# Altium footprint library 04.连接器件.pcb.PCBLIB: 363 footprints (part 10 of 23)
Each footprint in its own frame and in the unit in brackets; x right, y up, seen from the top. Pads: shape width x height; smd on the part's side, far side on the other; paste and mask are expansions set on the pad; w line width, h text height; cw(c..) or ccw(c..) is an arc to the next point about the centre after c.
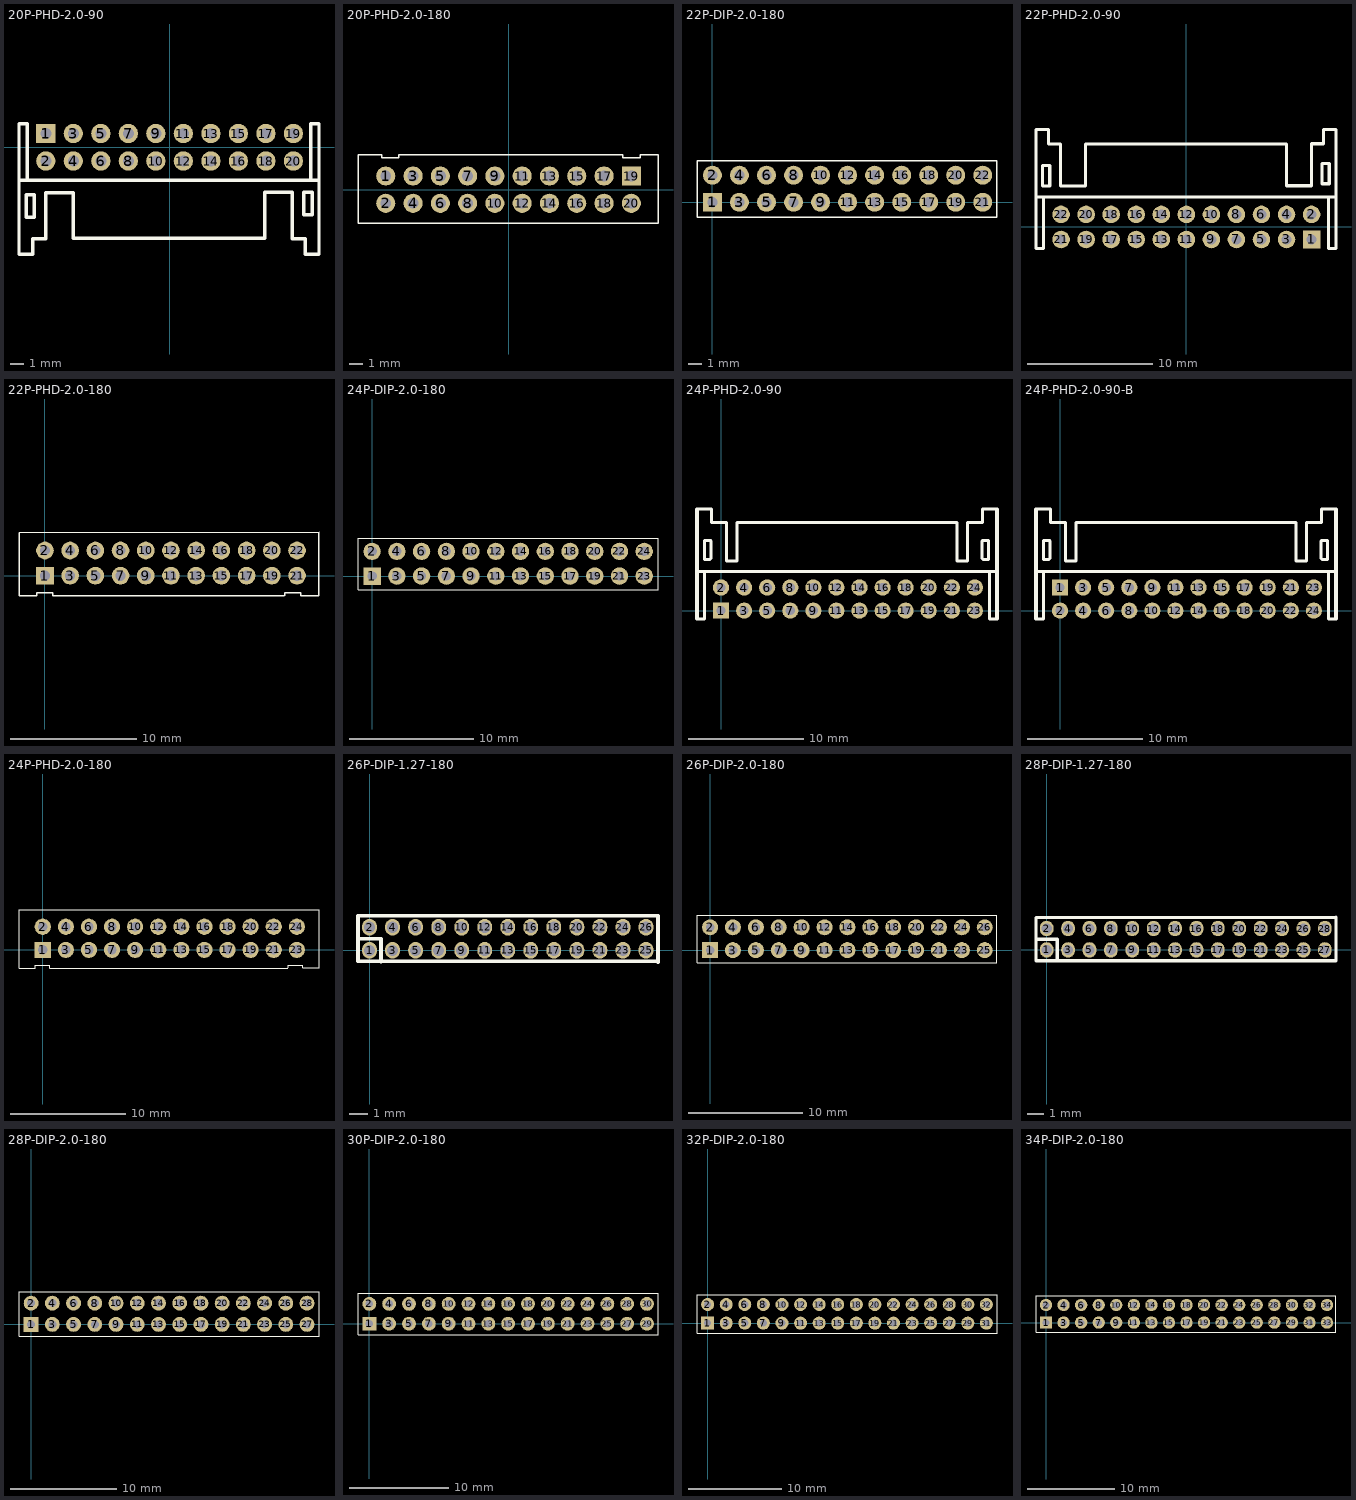
[diagram p9: the footprints below, top view; thin cyan lines are the x and y axes]

## 20P-PHD-2.0-90 [mm]
pads (20):
  rect 1.4x1.4 hole 0.8: 1(-9,1)
  round 1.4 hole 0.8: 2(-9,-1) 3(-7,1) 4(-7,-1) 5(-5,1) 6(-5,-1) 7(-3,1) 8(-3,-1) 9(-1,1) 10(-1,-1) 11(1,1) 12(1,-1) 13(3,1) 14(3,-1) 15(5,1) 16(5,-1) 17(7,1) 18(7,-1) 19(9,1) 20(9,-1)
TopOverlay:
  lines w0.254: -10.827,-2.404 -10.377,-2.404 ; -10.35,-2.404 -10.35,1.711 -10.95,1.711 -10.95,-7.789 -9.95,-7.789 -9.95,-6.645 -9,-6.645 -9,-3.293 -7,-3.293 -7,-6.62 3,-6.62 6.91,-6.62 ; -10.342,-2.404 8.71,-2.404 ; 6.91,-6.605 6.91,-3.278 8.91,-3.278 8.91,-6.631 9.86,-6.631 9.86,-7.774 10.86,-7.774 10.86,1.726 10.26,1.726 10.26,-2.389 ; 8.719,-2.404 10.818,-2.404 ; -10.417,-5.071 -9.832,-5.071 -9.832,-3.445 -10.417,-3.445 -10.417,-5.071 ; 9.768,-4.904 9.768,-3.278 10.352,-3.278 10.352,-4.904 9.768,-4.904
3D body: height 5, standoff 0, extent -10.95,-7.789 10.86,1.711

## 20P-PHD-2.0-180 [mm]
pads (20):
  round 1.4 hole 0.8: 1(-9,1) 2(-9,-1) 3(-7,1) 4(-7,-1) 5(-5,1) 6(-5,-1) 7(-3,1) 8(-3,-1) 9(-1,1) 10(-1,-1) 11(1,1) 12(1,-1) 13(3,1) 14(3,-1) 15(5,1) 16(5,-1) 17(7,1) 18(7,-1) 20(9,-1)
  rect 1.4x1.4 hole 0.8: 19(9,1)
TopOverlay:
  lines w0.1: -11.037,-2.48 10.957,-2.472 10.957,2.575 9.66,2.575 9.66,2.346 8.39,2.346 8.39,2.575 -8.042,2.575 -8.042,2.346 -9.312,2.346 -9.312,2.575 -11.037,2.575 -11.037,-2.48
3D body "IDC20(2.0).STEP": height 6.5, standoff -2.6, extent -11.043,-2.472 10.957,2.528

## 22P-DIP-2.0-180 [mm]
pads (22):
  rect 1.4x1.4 hole 0.75: 1(0,0)
  round 1.4 hole 0.75: 2(0,2) 3(2,0) 4(2,2) 5(4,0) 6(4,2) 7(6,0) 8(6,2) 9(8,0) 10(8,2) 11(10,0) 12(10,2) 13(12,0) 14(12,2) 15(14,0) 16(14,2) 17(16,0) 18(16,2) 19(18,0) 20(18,2) 21(20,0) 22(20,2)
TopOverlay:
  lines w0.1: -1.143,-1.118 21.057,-1.118 21.057,3.073 -1.143,3.073 -1.143,-1.118
3D body "DIP22(2.0)排针.": height 8, standoff -2.6, extent -1.041,-1.041 20.959,2.959

## 22P-PHD-2.0-90 [mm]
pads (22):
  rect 1.4x1.4 hole 0.8: 1(10,-1)
  round 1.4 hole 0.8: 2(10,1) 3(8,-1) 4(8,1) 5(6,-1) 6(6,1) 7(4,-1) 8(4,1) 9(2,-1) 10(2,1) 11(0,-1) 12(0,1) 13(-2,-1) 14(-2,1) 15(-4,-1) 16(-4,1) 17(-6,-1) 18(-6,1) 19(-8,-1) 20(-8,1) 21(-10,-1) 22(-10,1)
TopOverlay:
  lines w0.254: -11.962,2.404 -9.862,2.404 -7.71,2.404 11.342,2.404 ; -11.403,2.389 -11.403,-1.726 -12.003,-1.726 -12.003,7.774 -11.003,7.774 -11.003,6.631 -10.053,6.631 -10.053,3.278 -8.053,3.278 -8.053,6.605 ; -8.053,6.62 -2,6.62 8,6.62 8,3.293 10,3.293 10,6.645 10.95,6.645 10.95,7.789 11.95,7.789 11.95,-1.711 11.35,-1.711 11.35,2.404 ; 11.377,2.404 11.827,2.404 ; -11.495,3.278 -11.495,4.904 -10.911,4.904 -10.911,3.278 -11.495,3.278 ; 10.832,3.445 10.832,5.071 11.417,5.071 11.417,3.445 10.832,3.445
3D body: height 5, standoff 0, extent -12.003,-1.711 11.95,7.789

## 22P-PHD-2.0-180 [mm]
pads (22):
  rect 1.4x1.4 hole 0.8: 1(0,0)
  round 1.4 hole 0.8: 2(0,2) 3(2,0) 4(2,2) 5(4,0) 6(4,2) 7(6,0) 8(6,2) 9(8,0) 10(8,2) 11(10,0) 12(10,2) 13(12,0) 14(12,2) 15(14,0) 16(14,2) 17(16,0) 18(16,2) 19(18,0) 20(18,2) 21(20,0) 22(20,2)
TopOverlay:
  lines w0.1: 18.974,-1.575 0.61,-1.575 0.61,-1.346 -0.66,-1.346 -0.66,-1.575 -2.057,-1.575 -2.057,3.425 21.742,3.433 ; 19.042,-1.575 19.042,-1.346 20.312,-1.346 20.312,-1.575 21.709,-1.575 21.709,3.43
3D body "IDC22(2.0).STEP": height 6.5, standoff -2.6, extent -2.184,-1.549 21.816,3.451

## 24P-DIP-2.0-180 [mm]
pads (24):
  rect 1.4x1.4 hole 0.75: 1(0,0)
  round 1.4 hole 0.75: 2(0,2) 3(2,0) 4(2,2) 5(4,0) 6(4,2) 7(6,0) 8(6,2) 9(8,0) 10(8,2) 11(10,0) 12(10,2) 13(12,0) 14(12,2) 15(14,0) 16(14,2) 17(16,0) 18(16,2) 19(18,0) 20(18,2) 21(20,0) 22(20,2) 23(22,0) 24(22,2)
TopOverlay:
  lines w0.1: -1.143,-1.118 -1.143,3.073 23.114,3.073 23.114,-1.118 -1.143,-1.118
3D body "DIP24(2.0)排针.": height 8, standoff -2.6, extent -1.053,-1.016 22.947,2.984

## 24P-PHD-2.0-90 [mm]
pads (24):
  rect 1.4x1.4 hole 0.8: 1(0,0)
  round 1.4 hole 0.8: 2(0,2) 3(2,0) 4(2,2) 5(4,0) 6(4,2) 7(6,0) 8(6,2) 9(8,0) 10(8,2) 11(10,0) 12(10,2) 13(12,0) 14(12,2) 15(14,0) 16(14,2) 17(16,0) 18(16,2) 19(18,0) 20(18,2) 21(20,0) 22(20,2) 23(22,0) 24(22,2)
TopOverlay:
  lines w0.254: -2.083,3.404 23.917,3.404 ; -2.083,8.789 -0.838,8.789 -0.838,7.62 ; -2.073,-0.711 -1.422,-0.711 -1.422,3.404 ; -1.397,4.47 -1.422,4.445 ; -0.94,4.445 -1.422,4.445 ; -0.914,4.47 -0.864,4.521 -0.864,6.045 -0.889,6.071 -1.422,6.071 -1.422,4.445 ; -0.813,7.645 0.457,7.645 0.457,4.293 1.397,4.293 1.397,7.62 20.437,7.62 20.437,4.293 21.377,4.293 21.377,7.645 22.647,7.645 22.673,7.62 22.673,8.789 23.917,8.789 ; 22.682,4.47 22.631,4.521 22.631,6.045 22.657,6.071 23.19,6.071 23.19,4.445 ; 22.708,4.445 23.19,4.445 ; 23.165,4.47 23.19,4.445 ; 23.266,3.404 23.266,-0.711 23.917,-0.711
  lines w0.305: -2.083,-0.711 -2.083,8.789 ; 23.917,-0.711 23.917,8.789

## 24P-PHD-2.0-90-B [mm]
pads (24):
  rect 1.4x1.4 hole 0.8: 1(0,2)
  round 1.4 hole 0.8: 2(0,0) 3(2,2) 4(2,0) 5(4,2) 6(4,0) 7(6,2) 8(6,0) 9(8,2) 10(8,0) 11(10,2) 12(10,0) 13(12,2) 14(12,0) 15(14,2) 16(14,0) 17(16,2) 18(16,0) 19(18,2) 20(18,0) 21(20,2) 22(20,0) 23(22,2) 24(22,0)
TopOverlay:
  lines w0.254: -2.083,3.404 23.917,3.404 ; -2.083,8.789 -0.838,8.789 -0.838,7.62 ; -2.073,-0.711 -1.422,-0.711 -1.422,3.404 ; -1.397,4.47 -1.422,4.445 ; -0.94,4.445 -1.422,4.445 ; -0.914,4.47 -0.864,4.521 -0.864,6.045 -0.889,6.071 -1.422,6.071 -1.422,4.445 ; -0.813,7.645 0.457,7.645 0.457,4.293 1.397,4.293 1.397,7.62 20.437,7.62 20.437,4.293 21.377,4.293 21.377,7.645 22.647,7.645 22.673,7.62 22.673,8.789 23.917,8.789 ; 22.682,4.47 22.631,4.521 22.631,6.045 22.657,6.071 23.19,6.071 23.19,4.445 ; 22.708,4.445 23.19,4.445 ; 23.165,4.47 23.19,4.445 ; 23.266,3.404 23.266,-0.711 23.917,-0.711
  lines w0.305: -2.083,-0.711 -2.083,8.789 ; 23.917,-0.711 23.917,8.789

## 24P-PHD-2.0-180 [mm]
pads (24):
  rect 1.4x1.4 hole 0.8: 1(0,0)
  round 1.4 hole 0.8: 2(0,2) 3(2,0) 4(2,2) 5(4,0) 6(4,2) 7(6,0) 8(6,2) 9(8,0) 10(8,2) 11(10,0) 12(10,2) 13(12,0) 14(12,2) 15(14,0) 16(14,2) 17(16,0) 18(16,2) 19(18,0) 20(18,2) 21(20,0) 22(20,2) 23(22,0) 24(22,2)
TopOverlay:
  lines w0.1: 21.221,-1.575 0.61,-1.575 0.61,-1.346 -0.66,-1.346 -0.66,-1.575 -2.057,-1.575 -2.057,3.425 -2.028,3.454 23.917,3.454 23.917,-1.546 22.52,-1.546 22.52,-1.317 21.25,-1.317 21.25,-1.546
3D body "IDC24(2.0).STEP": height 6.5, standoff -2.6, extent -2.057,-1.509 23.943,3.491

## 26P-DIP-1.27-180 [mil]
pads (26):
  oval 32x36 hole 24: 1(0,0) 2(0,50) 3(50,0) 4(50,50) 5(100,0) 6(100,50) 7(150,0) 8(150,50) 9(200,0) 10(200,50) 11(250,0) 12(250,50) 13(300,0) 14(300,50) 15(350,0) 16(350,50) 17(400,0) 18(400,50) 19(450,0) 20(450,50) 21(500,0) 22(500,50) 23(550,0) 24(550,50) 25(600,0) 26(600,50)
TopOverlay:
  lines w8: -25,25 25,25 25,-25 ; 626,-26 626,74 ; 626,-24 -25,-24 -25,75 626,75

## 26P-DIP-2.0-180 [mm]
pads (26):
  rect 1.4x1.4 hole 0.75: 1(0,0)
  round 1.4 hole 0.75: 2(0,2) 3(2,0) 4(2,2) 5(4,0) 6(4,2) 7(6,0) 8(6,2) 9(8,0) 10(8,2) 11(10,0) 12(10,2) 13(12,0) 14(12,2) 15(14,0) 16(14,2) 17(16,0) 18(16,2) 19(18,0) 20(18,2) 21(20,0) 22(20,2) 23(22,0) 24(22,2) 25(24,0) 26(24,2)
TopOverlay:
  lines w0.1: -1.143,-1.118 -1.143,3.073 25.07,3.073 25.07,-1.118 -1.143,-1.118
3D body "DIP26(2.0)排针.": height 8, standoff -2.6, extent -1.041,-1.016 24.959,2.984

## 28P-DIP-1.27-180 [mil]
pads (28):
  oval 32x36 hole 24: 1(0,0) 2(0,50) 3(50,0) 4(50,50) 5(100,0) 6(100,50) 7(150,0) 8(150,50) 9(200,0) 10(200,50) 11(250,0) 12(250,50) 13(300,0) 14(300,50) 15(350,0) 16(350,50) 17(400,0) 18(400,50) 19(450,0) 20(450,50) 21(500,0) 22(500,50) 23(550,0) 24(550,50) 25(600,0) 26(600,50) 27(650,0) 28(650,50)
TopOverlay:
  lines w8: -25,25 25,25 25,-25 ; 676,75 676,-25 -25,-25 -25,75 676,76

## 28P-DIP-2.0-180 [mm]
pads (28):
  rect 1.4x1.4 hole 0.75: 1(0,0)
  round 1.4 hole 0.75: 2(0,2) 3(2,0) 4(2,2) 5(4,0) 6(4,2) 7(6,0) 8(6,2) 9(8,0) 10(8,2) 11(10,0) 12(10,2) 13(12,0) 14(12,2) 15(14,0) 16(14,2) 17(16,0) 18(16,2) 19(18,0) 20(18,2) 21(20,0) 22(20,2) 23(22,0) 24(22,2) 25(24,0) 26(24,2) 27(26,0) 28(26,2)
TopOverlay:
  lines w0.1: -1.143,-1.118 -1.143,3.073 27.127,3.073 27.127,-1.118 -1.143,-1.118
3D body "DIP28(2.0)排针.": height 8, standoff -2.6, extent -1.016,-1.041 26.984,2.959

## 30P-DIP-2.0-180 [mm]
pads (30):
  rect 1.4x1.4 hole 0.75: 1(0,0)
  round 1.4 hole 0.75: 2(0,2) 3(2,0) 4(2,2) 5(4,0) 6(4,2) 7(6,0) 8(6,2) 9(8,0) 10(8,2) 11(10,0) 12(10,2) 13(12,0) 14(12,2) 15(14,0) 16(14,2) 17(16,0) 18(16,2) 19(18,0) 20(18,2) 21(20,0) 22(20,2) 23(22,0) 24(22,2) 25(24,0) 26(24,2) 27(26,0) 28(26,2) 29(28,0) 30(28,2)
TopOverlay:
  lines w0.1: -1.143,-1.118 -1.143,3.073 29.108,3.073 29.108,-1.118 -1.143,-1.118
3D body "DIP30(2.0)排针.": height 8, standoff -2.6, extent -1.041,-1.016 28.959,2.984

## 32P-DIP-2.0-180 [mm]
pads (32):
  rect 1.4x1.4 hole 0.75: 1(0,0)
  round 1.4 hole 0.75: 2(0,2) 3(2,0) 4(2,2) 5(4,0) 6(4,2) 7(6,0) 8(6,2) 9(8,0) 10(8,2) 11(10,0) 12(10,2) 13(12,0) 14(12,2) 15(14,0) 16(14,2) 17(16,0) 18(16,2) 19(18,0) 20(18,2) 21(20,0) 22(20,2) 23(22,0) 24(22,2) 25(24,0) 26(24,2) 27(26,0) 28(26,2) 29(28,0) 30(28,2) 31(30,0) 32(30,2)
TopOverlay:
  lines w0.1: -1.143,-1.118 31.14,-1.118 31.14,3.073 -1.143,3.073 -1.143,-1.118
3D body "DIP32(2.0)排针.": height 8, standoff -2.6, extent -1.041,-1.016 30.959,2.984

## 34P-DIP-2.0-180 [mm]
pads (34):
  rect 1.4x1.4 hole 0.75: 1(0,0)
  round 1.4 hole 0.75: 2(0,2) 3(2,0) 4(2,2) 5(4,0) 6(4,2) 7(6,0) 8(6,2) 9(8,0) 10(8,2) 11(10,0) 12(10,2) 13(12,0) 14(12,2) 15(14,0) 16(14,2) 17(16,0) 18(16,2) 19(18,0) 20(18,2) 21(20,0) 22(20,2) 23(22,0) 24(22,2) 25(24,0) 26(24,2) 27(26,0) 28(26,2) 29(28,0) 30(28,2) 31(30,0) 32(30,2) 33(32,0) 34(32,2)
TopOverlay:
  lines w0.1: -1.143,-1.118 -1.143,3.073 33.02,3.073 33.02,-1.118 -1.143,-1.118
3D body "DIP36(2.0)排针.": height 8, standoff -2.6, extent -1.092,-1.041 34.908,2.959